# Altium footprint library Package_DIP.PcbLib: 236 footprints (part 8 of 15)
Each footprint in its own frame and in the unit in brackets; x right, y up, seen from the top. Pads: shape width x height; smd on the part's side, far side on the other; paste and mask are expansions set on the pad; w line width, h text height; cw(c..) or ccw(c..) is an arc to the next point about the centre after c.
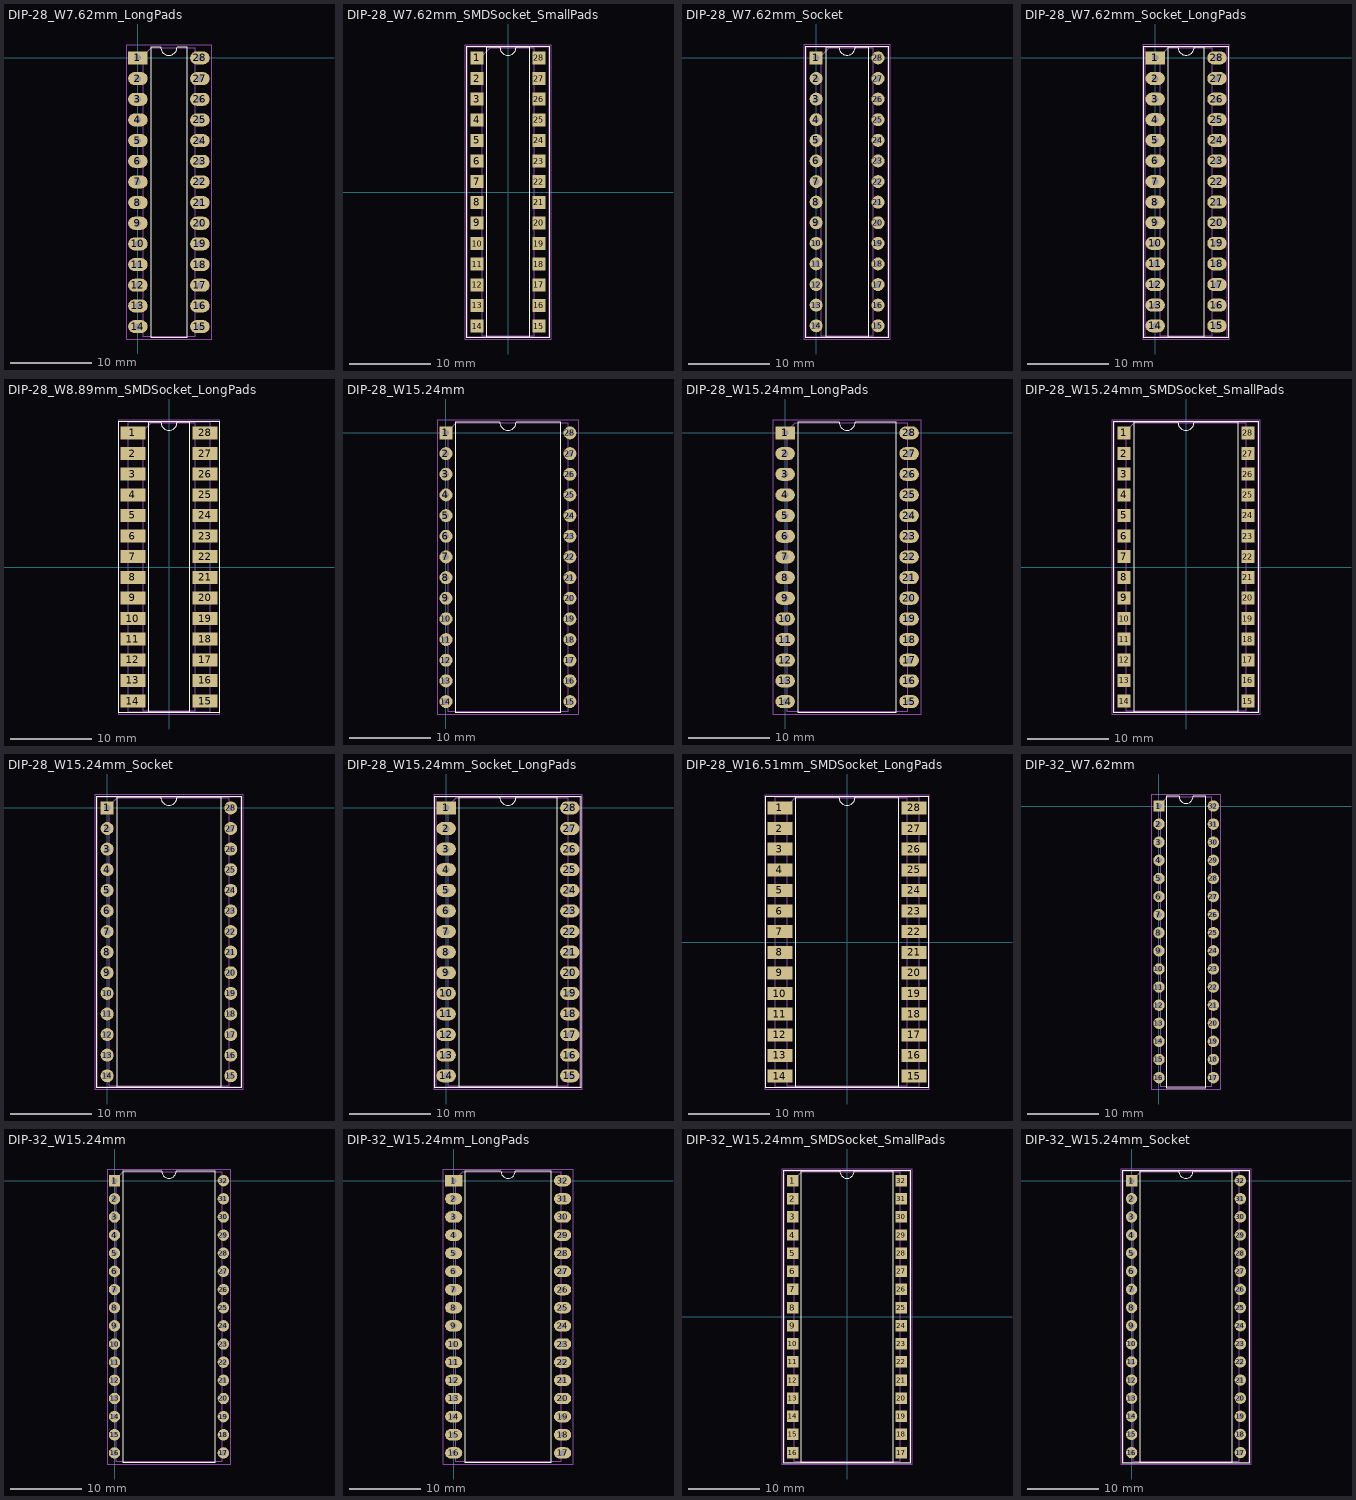
[diagram p7: the footprints below, top view; thin cyan lines are the x and y axes]

## DIP-28_W7.62mm_LongPads [mm]
pads (28):
  rect 2.4x1.6 hole 0.8: 1(0,0)
  rrect100% 2.4x1.6 hole 0.8: 2(0,-2.54) 3(0,-5.08) 4(0,-7.62) 5(0,-10.16) 6(0,-12.7) 7(0,-15.24) 8(0,-17.78) 9(0,-20.32) 10(0,-22.86) 11(0,-25.4) 12(0,-27.94) 13(0,-30.48) 14(0,-33.02) 15(7.62,-33.02) 16(7.62,-30.48) 17(7.62,-27.94) 18(7.62,-25.4) 19(7.62,-22.86) 20(7.62,-20.32) 21(7.62,-17.78) 22(7.62,-15.24) 23(7.62,-12.7) 24(7.62,-10.16) 25(7.62,-7.62) 26(7.62,-5.08) 27(7.62,-2.54) 28(7.62,0)
F.SilkS:
  lines w0.12: 1.56,-34.35 1.56,1.33 2.81,1.33 ccw(c3.81,1.33) 4.81,1.33 6.06,1.33 6.06,-34.35 1.56,-34.35
F.CrtYd:
  lines w0.05: -1.45,-34.55 -1.45,1.55 9.1,1.55 9.1,-34.55 -1.45,-34.55
F.Fab:
  lines w0.1: 0.635,-34.29 6.985,-34.29 6.985,1.27 1.635,1.27 0.635,0.27 0.635,-34.29
  text "'.Designator'" at -0.237,-17.35 h1

## DIP-28_W7.62mm_SMDSocket_SmallPads [mm]
pads (28):
  rect 1.6x1.6 smd: 1(-3.81,16.51) 2(-3.81,13.97) 3(-3.81,11.43) 4(-3.81,8.89) 5(-3.81,6.35) 6(-3.81,3.81) 7(-3.81,1.27) 8(-3.81,-1.27) 9(-3.81,-3.81) 10(-3.81,-6.35) 11(-3.81,-8.89) 12(-3.81,-11.43) 13(-3.81,-13.97) 14(-3.81,-16.51) 15(3.81,-16.51) 16(3.81,-13.97) 17(3.81,-11.43) 18(3.81,-8.89) 19(3.81,-6.35) 20(3.81,-3.81) 21(3.81,-1.27) 22(3.81,1.27) 23(3.81,3.81) 24(3.81,6.35) 25(3.81,8.89) 26(3.81,11.43) 27(3.81,13.97) 28(3.81,16.51)
F.SilkS:
  lines w0.12: -5.14,-17.9 5.14,-17.9 5.14,17.9 -5.14,17.9 -5.14,-17.9 ; -2.65,-17.84 2.65,-17.84 2.65,17.84 1,17.84 cw(c0,17.84) -1,17.84 -2.65,17.84 -2.65,-17.84
F.CrtYd:
  lines w0.05: -5.35,-18.1 -5.35,18.1 5.35,18.1 5.35,-18.1 -5.35,-18.1
F.Fab:
  lines w0.1: -5.08,-17.84 5.08,-17.84 5.08,17.84 -5.08,17.84 -5.08,-17.84 ; -3.175,-17.78 3.175,-17.78 3.175,17.78 -2.175,17.78 -3.175,16.78 -3.175,-17.78
  text "'.Designator'" at -4.047,-0.84 h1

## DIP-28_W7.62mm_Socket [mm]
pads (28):
  rect 1.6x1.6 hole 0.8: 1(0,0)
  rrect100% 1.6x1.6 hole 0.8: 2(0,-2.54) 3(0,-5.08) 4(0,-7.62) 5(0,-10.16) 6(0,-12.7) 7(0,-15.24) 8(0,-17.78) 9(0,-20.32) 10(0,-22.86) 11(0,-25.4) 12(0,-27.94) 13(0,-30.48) 14(0,-33.02) 15(7.62,-33.02) 16(7.62,-30.48) 17(7.62,-27.94) 18(7.62,-25.4) 19(7.62,-22.86) 20(7.62,-20.32) 21(7.62,-17.78) 22(7.62,-15.24) 23(7.62,-12.7) 24(7.62,-10.16) 25(7.62,-7.62) 26(7.62,-5.08) 27(7.62,-2.54) 28(7.62,0)
F.SilkS:
  lines w0.12: -1.33,-34.41 8.95,-34.41 8.95,1.39 -1.33,1.39 -1.33,-34.41 ; 1.16,-34.35 6.46,-34.35 6.46,1.33 4.81,1.33 cw(c3.81,1.33) 2.81,1.33 1.16,1.33 1.16,-34.35
F.CrtYd:
  lines w0.05: -1.55,-34.65 9.15,-34.65 9.15,1.6 -1.55,1.6 -1.55,-34.65
F.Fab:
  lines w0.1: -1.27,-34.35 -1.27,1.33 8.89,1.33 8.89,-34.35 -1.27,-34.35 ; 0.635,-34.29 0.635,0.27 1.635,1.27 6.985,1.27 6.985,-34.29 0.635,-34.29
  text "'.Designator'" at -0.237,-17.35 h1

## DIP-28_W7.62mm_Socket_LongPads [mm]
pads (28):
  rect 2.4x1.6 hole 0.8: 1(0,0)
  rrect100% 2.4x1.6 hole 0.8: 2(0,-2.54) 3(0,-5.08) 4(0,-7.62) 5(0,-10.16) 6(0,-12.7) 7(0,-15.24) 8(0,-17.78) 9(0,-20.32) 10(0,-22.86) 11(0,-25.4) 12(0,-27.94) 13(0,-30.48) 14(0,-33.02) 15(7.62,-33.02) 16(7.62,-30.48) 17(7.62,-27.94) 18(7.62,-25.4) 19(7.62,-22.86) 20(7.62,-20.32) 21(7.62,-17.78) 22(7.62,-15.24) 23(7.62,-12.7) 24(7.62,-10.16) 25(7.62,-7.62) 26(7.62,-5.08) 27(7.62,-2.54) 28(7.62,0)
F.SilkS:
  lines w0.12: -1.44,-34.41 9.06,-34.41 9.06,1.39 -1.44,1.39 -1.44,-34.41 ; 1.56,-34.35 1.56,1.33 2.81,1.33 ccw(c3.81,1.33) 4.81,1.33 6.06,1.33 6.06,-34.35 1.56,-34.35
F.CrtYd:
  lines w0.05: -1.55,-34.65 9.15,-34.65 9.15,1.6 -1.55,1.6 -1.55,-34.65
F.Fab:
  lines w0.1: -1.27,-34.35 -1.27,1.33 8.89,1.33 8.89,-34.35 -1.27,-34.35 ; 0.635,-34.29 0.635,0.27 1.635,1.27 6.985,1.27 6.985,-34.29 0.635,-34.29
  text "'.Designator'" at -0.237,-17.35 h1

## DIP-28_W8.89mm_SMDSocket_LongPads [mm]
pads (28):
  rect 3.1x1.6 smd: 1(-4.445,16.51) 2(-4.445,13.97) 3(-4.445,11.43) 4(-4.445,8.89) 5(-4.445,6.35) 6(-4.445,3.81) 7(-4.445,1.27) 8(-4.445,-1.27) 9(-4.445,-3.81) 10(-4.445,-6.35) 11(-4.445,-8.89) 12(-4.445,-11.43) 13(-4.445,-13.97) 14(-4.445,-16.51) 15(4.445,-16.51) 16(4.445,-13.97) 17(4.445,-11.43) 18(4.445,-8.89) 19(4.445,-6.35) 20(4.445,-3.81) 21(4.445,-1.27) 22(4.445,1.27) 23(4.445,3.81) 24(4.445,6.35) 25(4.445,8.89) 26(4.445,11.43) 27(4.445,13.97) 28(4.445,16.51)
F.SilkS:
  lines w0.12: -6.235,-17.9 -6.235,17.9 6.235,17.9 6.235,-17.9 -6.235,-17.9 ; -2.535,-17.84 2.535,-17.84 2.535,17.84 1,17.84 cw(c0,17.84) -1,17.84 -2.535,17.84 -2.535,-17.84
F.CrtYd:
  lines w0.05: -6.25,-18.1 -6.25,18.1 6.25,18.1 6.25,-18.1 -6.25,-18.1
F.Fab:
  lines w0.1: -5.08,-17.84 5.08,-17.84 5.08,17.84 -5.08,17.84 -5.08,-17.84 ; -3.175,-17.78 -3.175,16.78 -2.175,17.78 3.175,17.78 3.175,-17.78 -3.175,-17.78
  text "'.Designator'" at -4.047,-0.84 h1

## DIP-28_W15.24mm [mm]
pads (28):
  rect 1.6x1.6 hole 0.8: 1(0,0)
  rrect100% 1.6x1.6 hole 0.8: 2(0,-2.54) 3(0,-5.08) 4(0,-7.62) 5(0,-10.16) 6(0,-12.7) 7(0,-15.24) 8(0,-17.78) 9(0,-20.32) 10(0,-22.86) 11(0,-25.4) 12(0,-27.94) 13(0,-30.48) 14(0,-33.02) 15(15.24,-33.02) 16(15.24,-30.48) 17(15.24,-27.94) 18(15.24,-25.4) 19(15.24,-22.86) 20(15.24,-20.32) 21(15.24,-17.78) 22(15.24,-15.24) 23(15.24,-12.7) 24(15.24,-10.16) 25(15.24,-7.62) 26(15.24,-5.08) 27(15.24,-2.54) 28(15.24,0)
F.SilkS:
  lines w0.12: 1.16,-34.35 1.16,1.33 6.62,1.33 ccw(c7.62,1.33) 8.62,1.33 14.08,1.33 14.08,-34.35 1.16,-34.35
F.CrtYd:
  lines w0.05: -1.05,-34.55 16.3,-34.55 16.3,1.55 -1.05,1.55 -1.05,-34.55
F.Fab:
  lines w0.1: 0.255,-34.29 14.985,-34.29 14.985,1.27 1.255,1.27 0.255,0.27 0.255,-34.29
  text "'.Designator'" at 3.573,-17.35 h1

## DIP-28_W15.24mm_LongPads [mm]
pads (28):
  rect 2.4x1.6 hole 0.8: 1(0,0)
  rrect100% 2.4x1.6 hole 0.8: 2(0,-2.54) 3(0,-5.08) 4(0,-7.62) 5(0,-10.16) 6(0,-12.7) 7(0,-15.24) 8(0,-17.78) 9(0,-20.32) 10(0,-22.86) 11(0,-25.4) 12(0,-27.94) 13(0,-30.48) 14(0,-33.02) 15(15.24,-33.02) 16(15.24,-30.48) 17(15.24,-27.94) 18(15.24,-25.4) 19(15.24,-22.86) 20(15.24,-20.32) 21(15.24,-17.78) 22(15.24,-15.24) 23(15.24,-12.7) 24(15.24,-10.16) 25(15.24,-7.62) 26(15.24,-5.08) 27(15.24,-2.54) 28(15.24,0)
F.SilkS:
  lines w0.12: 1.56,-34.35 13.68,-34.35 13.68,1.33 8.62,1.33 cw(c7.62,1.33) 6.62,1.33 1.56,1.33 1.56,-34.35
F.CrtYd:
  lines w0.05: -1.5,-34.55 -1.5,1.55 16.7,1.55 16.7,-34.55 -1.5,-34.55
F.Fab:
  lines w0.1: 0.255,-34.29 14.985,-34.29 14.985,1.27 1.255,1.27 0.255,0.27 0.255,-34.29
  text "'.Designator'" at 3.573,-17.35 h1

## DIP-28_W15.24mm_SMDSocket_SmallPads [mm]
pads (28):
  rect 1.6x1.6 smd: 1(-7.62,16.51) 2(-7.62,13.97) 3(-7.62,11.43) 4(-7.62,8.89) 5(-7.62,6.35) 6(-7.62,3.81) 7(-7.62,1.27) 8(-7.62,-1.27) 9(-7.62,-3.81) 10(-7.62,-6.35) 11(-7.62,-8.89) 12(-7.62,-11.43) 13(-7.62,-13.97) 14(-7.62,-16.51) 15(7.62,-16.51) 16(7.62,-13.97) 17(7.62,-11.43) 18(7.62,-8.89) 19(7.62,-6.35) 20(7.62,-3.81) 21(7.62,-1.27) 22(7.62,1.27) 23(7.62,3.81) 24(7.62,6.35) 25(7.62,8.89) 26(7.62,11.43) 27(7.62,13.97) 28(7.62,16.51)
F.SilkS:
  lines w0.12: -8.95,-17.9 8.95,-17.9 8.95,17.9 -8.95,17.9 -8.95,-17.9 ; -6.46,-17.84 -6.46,17.84 -1,17.84 ccw(c0,17.84) 1,17.84 6.46,17.84 6.46,-17.84 -6.46,-17.84
F.CrtYd:
  lines w0.05: -9.15,-18.1 9.15,-18.1 9.15,18.1 -9.15,18.1 -9.15,-18.1
F.Fab:
  lines w0.1: -8.89,-17.84 8.89,-17.84 8.89,17.84 -8.89,17.84 -8.89,-17.84 ; -7.365,-17.78 7.365,-17.78 7.365,17.78 -6.365,17.78 -7.365,16.78 -7.365,-17.78
  text "'.Designator'" at -4.047,-0.84 h1

## DIP-28_W15.24mm_Socket [mm]
pads (28):
  rect 1.6x1.6 hole 0.8: 1(0,0)
  rrect100% 1.6x1.6 hole 0.8: 2(0,-2.54) 3(0,-5.08) 4(0,-7.62) 5(0,-10.16) 6(0,-12.7) 7(0,-15.24) 8(0,-17.78) 9(0,-20.32) 10(0,-22.86) 11(0,-25.4) 12(0,-27.94) 13(0,-30.48) 14(0,-33.02) 15(15.24,-33.02) 16(15.24,-30.48) 17(15.24,-27.94) 18(15.24,-25.4) 19(15.24,-22.86) 20(15.24,-20.32) 21(15.24,-17.78) 22(15.24,-15.24) 23(15.24,-12.7) 24(15.24,-10.16) 25(15.24,-7.62) 26(15.24,-5.08) 27(15.24,-2.54) 28(15.24,0)
F.SilkS:
  lines w0.12: -1.33,-34.41 -1.33,1.39 16.57,1.39 16.57,-34.41 -1.33,-34.41 ; 1.16,-34.35 14.08,-34.35 14.08,1.33 8.62,1.33 cw(c7.62,1.33) 6.62,1.33 1.16,1.33 1.16,-34.35
F.CrtYd:
  lines w0.05: -1.55,-34.65 16.8,-34.65 16.8,1.6 -1.55,1.6 -1.55,-34.65
F.Fab:
  lines w0.1: -1.27,-34.35 -1.27,1.33 16.51,1.33 16.51,-34.35 -1.27,-34.35 ; 0.255,-34.29 0.255,0.27 1.255,1.27 14.985,1.27 14.985,-34.29 0.255,-34.29
  text "'.Designator'" at 3.573,-17.35 h1

## DIP-28_W15.24mm_Socket_LongPads [mm]
pads (28):
  rect 2.4x1.6 hole 0.8: 1(0,0)
  rrect100% 2.4x1.6 hole 0.8: 2(0,-2.54) 3(0,-5.08) 4(0,-7.62) 5(0,-10.16) 6(0,-12.7) 7(0,-15.24) 8(0,-17.78) 9(0,-20.32) 10(0,-22.86) 11(0,-25.4) 12(0,-27.94) 13(0,-30.48) 14(0,-33.02) 15(15.24,-33.02) 16(15.24,-30.48) 17(15.24,-27.94) 18(15.24,-25.4) 19(15.24,-22.86) 20(15.24,-20.32) 21(15.24,-17.78) 22(15.24,-15.24) 23(15.24,-12.7) 24(15.24,-10.16) 25(15.24,-7.62) 26(15.24,-5.08) 27(15.24,-2.54) 28(15.24,0)
F.SilkS:
  lines w0.12: -1.44,-34.41 -1.44,1.39 16.68,1.39 16.68,-34.41 -1.44,-34.41 ; 1.56,-34.35 13.68,-34.35 13.68,1.33 8.62,1.33 cw(c7.62,1.33) 6.62,1.33 1.56,1.33 1.56,-34.35
F.CrtYd:
  lines w0.05: -1.55,-34.65 16.8,-34.65 16.8,1.6 -1.55,1.6 -1.55,-34.65
F.Fab:
  lines w0.1: -1.27,-34.35 -1.27,1.33 16.51,1.33 16.51,-34.35 -1.27,-34.35 ; 0.255,-34.29 14.985,-34.29 14.985,1.27 1.255,1.27 0.255,0.27 0.255,-34.29
  text "'.Designator'" at 3.573,-17.35 h1

## DIP-28_W16.51mm_SMDSocket_LongPads [mm]
pads (28):
  rect 3.1x1.6 smd: 1(-8.255,16.51) 2(-8.255,13.97) 3(-8.255,11.43) 4(-8.255,8.89) 5(-8.255,6.35) 6(-8.255,3.81) 7(-8.255,1.27) 8(-8.255,-1.27) 9(-8.255,-3.81) 10(-8.255,-6.35) 11(-8.255,-8.89) 12(-8.255,-11.43) 13(-8.255,-13.97) 14(-8.255,-16.51) 15(8.255,-16.51) 16(8.255,-13.97) 17(8.255,-11.43) 18(8.255,-8.89) 19(8.255,-6.35) 20(8.255,-3.81) 21(8.255,-1.27) 22(8.255,1.27) 23(8.255,3.81) 24(8.255,6.35) 25(8.255,8.89) 26(8.255,11.43) 27(8.255,13.97) 28(8.255,16.51)
F.SilkS:
  lines w0.12: -10.045,-17.9 -10.045,17.9 10.045,17.9 10.045,-17.9 -10.045,-17.9 ; -6.345,-17.84 -6.345,17.84 -1,17.84 ccw(c0,17.84) 1,17.84 6.345,17.84 6.345,-17.84 -6.345,-17.84
F.CrtYd:
  lines w0.05: -10.1,-18.1 -10.1,18.1 10.1,18.1 10.1,-18.1 -10.1,-18.1
F.Fab:
  lines w0.1: -8.89,-17.84 8.89,-17.84 8.89,17.84 -8.89,17.84 -8.89,-17.84 ; -7.365,-17.78 7.365,-17.78 7.365,17.78 -6.365,17.78 -7.365,16.78 -7.365,-17.78
  text "'.Designator'" at -4.047,-0.84 h1

## DIP-32_W7.62mm [mm]
pads (32):
  rect 1.6x1.6 hole 0.8: 1(0,0)
  rrect100% 1.6x1.6 hole 0.8: 2(0,-2.54) 3(0,-5.08) 4(0,-7.62) 5(0,-10.16) 6(0,-12.7) 7(0,-15.24) 8(0,-17.78) 9(0,-20.32) 10(0,-22.86) 11(0,-25.4) 12(0,-27.94) 13(0,-30.48) 14(0,-33.02) 15(0,-35.56) 16(0,-38.1) 17(7.62,-38.1) 18(7.62,-35.56) 19(7.62,-33.02) 20(7.62,-30.48) 21(7.62,-27.94) 22(7.62,-25.4) 23(7.62,-22.86) 24(7.62,-20.32) 25(7.62,-17.78) 26(7.62,-15.24) 27(7.62,-12.7) 28(7.62,-10.16) 29(7.62,-7.62) 30(7.62,-5.08) 31(7.62,-2.54) 32(7.62,0)
F.SilkS:
  lines w0.12: 1.04,-39.49 6.58,-39.49 6.58,1.39 4.81,1.39 cw(c3.81,1.39) 2.81,1.39 1.04,1.39 1.04,-39.49
F.CrtYd:
  lines w0.05: -1.1,-39.7 -1.1,1.6 8.68,1.6 8.68,-39.7 -1.1,-39.7
F.Fab:
  lines w0.1: 0.255,-39.37 0.255,0.27 1.255,1.27 7.365,1.27 7.365,-39.37 0.255,-39.37
  text "'.Designator'" at -0.237,-19.89 h1

## DIP-32_W15.24mm [mm]
pads (32):
  rect 1.6x1.6 hole 0.8: 1(0,0)
  rrect100% 1.6x1.6 hole 0.8: 2(0,-2.54) 3(0,-5.08) 4(0,-7.62) 5(0,-10.16) 6(0,-12.7) 7(0,-15.24) 8(0,-17.78) 9(0,-20.32) 10(0,-22.86) 11(0,-25.4) 12(0,-27.94) 13(0,-30.48) 14(0,-33.02) 15(0,-35.56) 16(0,-38.1) 17(15.24,-38.1) 18(15.24,-35.56) 19(15.24,-33.02) 20(15.24,-30.48) 21(15.24,-27.94) 22(15.24,-25.4) 23(15.24,-22.86) 24(15.24,-20.32) 25(15.24,-17.78) 26(15.24,-15.24) 27(15.24,-12.7) 28(15.24,-10.16) 29(15.24,-7.62) 30(15.24,-5.08) 31(15.24,-2.54) 32(15.24,0)
F.SilkS:
  lines w0.12: 1.16,-39.43 1.16,1.33 6.62,1.33 ccw(c7.62,1.33) 8.62,1.33 14.08,1.33 14.08,-39.43 1.16,-39.43
F.CrtYd:
  lines w0.05: -1.05,-39.65 16.3,-39.65 16.3,1.55 -1.05,1.55 -1.05,-39.65
F.Fab:
  lines w0.1: 0.255,-39.37 14.985,-39.37 14.985,1.27 1.255,1.27 0.255,0.27 0.255,-39.37
  text "'.Designator'" at 3.573,-19.89 h1

## DIP-32_W15.24mm_LongPads [mm]
pads (32):
  rect 2.4x1.6 hole 0.8: 1(0,0)
  rrect100% 2.4x1.6 hole 0.8: 2(0,-2.54) 3(0,-5.08) 4(0,-7.62) 5(0,-10.16) 6(0,-12.7) 7(0,-15.24) 8(0,-17.78) 9(0,-20.32) 10(0,-22.86) 11(0,-25.4) 12(0,-27.94) 13(0,-30.48) 14(0,-33.02) 15(0,-35.56) 16(0,-38.1) 17(15.24,-38.1) 18(15.24,-35.56) 19(15.24,-33.02) 20(15.24,-30.48) 21(15.24,-27.94) 22(15.24,-25.4) 23(15.24,-22.86) 24(15.24,-20.32) 25(15.24,-17.78) 26(15.24,-15.24) 27(15.24,-12.7) 28(15.24,-10.16) 29(15.24,-7.62) 30(15.24,-5.08) 31(15.24,-2.54) 32(15.24,0)
F.SilkS:
  lines w0.12: 1.56,-39.43 1.56,1.33 6.62,1.33 ccw(c7.62,1.33) 8.62,1.33 13.68,1.33 13.68,-39.43 1.56,-39.43
F.CrtYd:
  lines w0.05: -1.5,-39.65 16.7,-39.65 16.7,1.55 -1.5,1.55 -1.5,-39.65
F.Fab:
  lines w0.1: 0.255,-39.37 0.255,0.27 1.255,1.27 14.985,1.27 14.985,-39.37 0.255,-39.37
  text "'.Designator'" at 3.573,-19.89 h1

## DIP-32_W15.24mm_SMDSocket_SmallPads [mm]
pads (32):
  rect 1.6x1.6 smd: 1(-7.62,19.05) 2(-7.62,16.51) 3(-7.62,13.97) 4(-7.62,11.43) 5(-7.62,8.89) 6(-7.62,6.35) 7(-7.62,3.81) 8(-7.62,1.27) 9(-7.62,-1.27) 10(-7.62,-3.81) 11(-7.62,-6.35) 12(-7.62,-8.89) 13(-7.62,-11.43) 14(-7.62,-13.97) 15(-7.62,-16.51) 16(-7.62,-19.05) 17(7.62,-19.05) 18(7.62,-16.51) 19(7.62,-13.97) 20(7.62,-11.43) 21(7.62,-8.89) 22(7.62,-6.35) 23(7.62,-3.81) 24(7.62,-1.27) 25(7.62,1.27) 26(7.62,3.81) 27(7.62,6.35) 28(7.62,8.89) 29(7.62,11.43) 30(7.62,13.97) 31(7.62,16.51) 32(7.62,19.05)
F.SilkS:
  lines w0.12: -8.95,-20.44 -8.95,20.44 8.95,20.44 8.95,-20.44 -8.95,-20.44 ; -6.46,-20.38 6.46,-20.38 6.46,20.38 1,20.38 cw(c0,20.38) -1,20.38 -6.46,20.38 -6.46,-20.38
F.CrtYd:
  lines w0.05: -9.15,-20.65 9.15,-20.65 9.15,20.65 -9.15,20.65 -9.15,-20.65
F.Fab:
  lines w0.1: -8.89,-20.38 8.89,-20.38 8.89,20.38 -8.89,20.38 -8.89,-20.38 ; -7.365,-20.32 -7.365,19.32 -6.365,20.32 7.365,20.32 7.365,-20.32 -7.365,-20.32
  text "'.Designator'" at -4.047,-0.84 h1

## DIP-32_W15.24mm_Socket [mm]
pads (32):
  rect 1.6x1.6 hole 0.8: 1(0,0)
  rrect100% 1.6x1.6 hole 0.8: 2(0,-2.54) 3(0,-5.08) 4(0,-7.62) 5(0,-10.16) 6(0,-12.7) 7(0,-15.24) 8(0,-17.78) 9(0,-20.32) 10(0,-22.86) 11(0,-25.4) 12(0,-27.94) 13(0,-30.48) 14(0,-33.02) 15(0,-35.56) 16(0,-38.1) 17(15.24,-38.1) 18(15.24,-35.56) 19(15.24,-33.02) 20(15.24,-30.48) 21(15.24,-27.94) 22(15.24,-25.4) 23(15.24,-22.86) 24(15.24,-20.32) 25(15.24,-17.78) 26(15.24,-15.24) 27(15.24,-12.7) 28(15.24,-10.16) 29(15.24,-7.62) 30(15.24,-5.08) 31(15.24,-2.54) 32(15.24,0)
F.SilkS:
  lines w0.12: -1.33,-39.49 16.57,-39.49 16.57,1.39 -1.33,1.39 -1.33,-39.49 ; 1.16,-39.43 1.16,1.33 6.62,1.33 ccw(c7.62,1.33) 8.62,1.33 14.08,1.33 14.08,-39.43 1.16,-39.43
F.CrtYd:
  lines w0.05: -1.55,-39.7 16.8,-39.7 16.8,1.6 -1.55,1.6 -1.55,-39.7
F.Fab:
  lines w0.1: -1.27,-39.43 16.51,-39.43 16.51,1.33 -1.27,1.33 -1.27,-39.43 ; 0.255,-39.37 14.985,-39.37 14.985,1.27 1.255,1.27 0.255,0.27 0.255,-39.37
  text "'.Designator'" at 3.573,-19.89 h1